# Altium schematic symbol library jlcpcb_2025_04_inductors_extended_0603.schlib: 1269 symbols (part 2 of 7) (continued)
## FCI1608F-R47K
designator L?  Inductance: 470nH
Inductor, 470nH, ±10%, 1.35Ω, 35mA, SMD 0603; Manufacturer: TAI-TECH; Manufacturer Part Number: FCI1608F-R47K; Package Size: 0603; JLCPCB Basic Part: No; JLCPCB Part Number: C155015; Supplier 1: LCSC; Category: Inductors; Supplier Part Number 1: C155015; Tolerance: ±10%; Rated Current: 35mA; DC Resistance: 1.35Ω; RoHS: Yes; ComponentLink1Description: Datasheet; ComponentLink1URL: https://wmsc.lcsc.com/wmsc/upload/file/pdf/v2/lcsc/2009171305_TAI-TECH-FCI1608F-R47K_C155015.pdf; ComponentLink2Description: JLCPCB Part URL; ComponentLink2URL: https://jlcpcb.com/partdetail/C155015; ComponentLink3Description: LCSC Part URL; ComponentLink3URL: https://lcsc.com/product-detail/Inductors-SMD_TAI-TECH-TAI-TECH-FCI1608F-R47K_C155015.html
footprint IND-0603 (0603 (1608M) Inductor)
pins: 1, 2

## FCI1608F-R56K
designator L?  Inductance: 560nH
Inductor, 560nH, ±10%, 1.55Ω, 35mA, SMD 0603; Manufacturer: TAI-TECH; Manufacturer Part Number: FCI1608F-R56K; Package Size: 0603; JLCPCB Basic Part: No; JLCPCB Part Number: C155016; Supplier 1: LCSC; Category: Inductors; Supplier Part Number 1: C155016; Tolerance: ±10%; Rated Current: 35mA; DC Resistance: 1.55Ω; RoHS: Yes; ComponentLink1Description: Datasheet; ComponentLink1URL: https://wmsc.lcsc.com/wmsc/upload/file/pdf/v2/lcsc/2009171305_TAI-TECH-FCI1608F-R56K_C155016.pdf; ComponentLink2Description: JLCPCB Part URL; ComponentLink2URL: https://jlcpcb.com/partdetail/C155016; ComponentLink3Description: LCSC Part URL; ComponentLink3URL: https://lcsc.com/product-detail/Inductors-SMD_TAI-TECH-TAI-TECH-FCI1608F-R56K_C155016.html
footprint IND-0603 (0603 (1608M) Inductor)
pins: 1, 2

## FCI1608F-R68K
designator L?  Inductance: 680nH
Inductor, 680nH, ±10%, 1.7Ω, 35mA, SMD 0603; Manufacturer: TAI-TECH; Manufacturer Part Number: FCI1608F-R68K; Package Size: 0603; JLCPCB Basic Part: No; JLCPCB Part Number: C155017; Supplier 1: LCSC; Category: Inductors; Supplier Part Number 1: C155017; Tolerance: ±10%; Rated Current: 35mA; DC Resistance: 1.7Ω; RoHS: Yes; ComponentLink1Description: Datasheet; ComponentLink1URL: https://wmsc.lcsc.com/wmsc/upload/file/pdf/v2/lcsc/2009171305_TAI-TECH-FCI1608F-R68K_C155017.pdf; ComponentLink2Description: JLCPCB Part URL; ComponentLink2URL: https://jlcpcb.com/partdetail/C155017; ComponentLink3Description: LCSC Part URL; ComponentLink3URL: https://lcsc.com/product-detail/Inductors-SMD_TAI-TECH-TAI-TECH-FCI1608F-R68K_C155017.html
footprint IND-0603 (0603 (1608M) Inductor)
pins: 1, 2

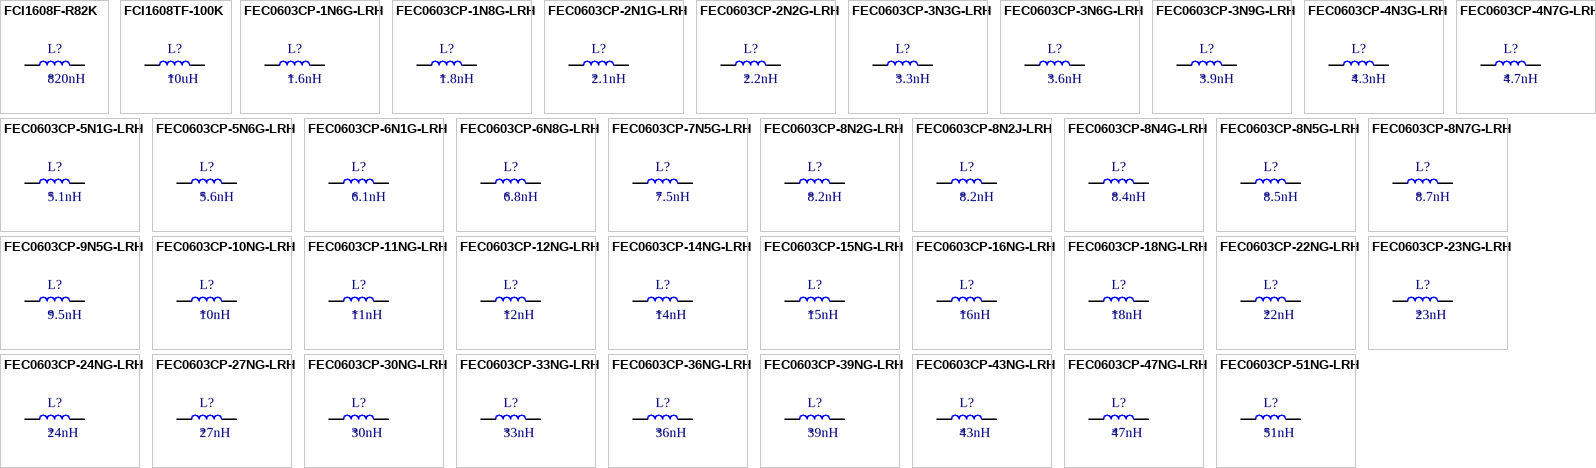
[diagram p6: symbols FCI1608F-R82K to FEC0603CP-51NG-LRH]

## FCI1608F-R82K
designator L?  Inductance: 820nH
Inductor, 820nH, ±10%, 2.1Ω, 35mA, SMD 0603; Manufacturer: TAI-TECH; Manufacturer Part Number: FCI1608F-R82K; Package Size: 0603; JLCPCB Basic Part: No; JLCPCB Part Number: C155018; Supplier 1: LCSC; Category: Inductors; Supplier Part Number 1: C155018; Tolerance: ±10%; Rated Current: 35mA; DC Resistance: 2.1Ω; RoHS: Yes; ComponentLink1Description: Datasheet; ComponentLink1URL: https://wmsc.lcsc.com/wmsc/upload/file/pdf/v2/lcsc/2009171305_TAI-TECH-FCI1608F-R82K_C155018.pdf; ComponentLink2Description: JLCPCB Part URL; ComponentLink2URL: https://jlcpcb.com/partdetail/C155018; ComponentLink3Description: LCSC Part URL; ComponentLink3URL: https://lcsc.com/product-detail/Inductors-SMD_TAI-TECH-TAI-TECH-FCI1608F-R82K_C155018.html
footprint IND-0603 (0603 (1608M) Inductor)
pins: 1, 2

## FCI1608TF-100K
designator L?  Inductance: 10uH
Inductor, 10uH, ±10%, 2.55Ω, 15mA, SMD 0603; Manufacturer: TAI-TECH; Manufacturer Part Number: FCI1608TF-100K; Package Size: 0603; JLCPCB Basic Part: No; JLCPCB Part Number: C304234; Supplier 1: LCSC; Category: Inductors; Supplier Part Number 1: C304234; Tolerance: ±10%; Rated Current: 15mA; DC Resistance: 2.55Ω; RoHS: Yes; ComponentLink1Description: Datasheet; ComponentLink1URL: https://wmsc.lcsc.com/wmsc/upload/file/pdf/v2/lcsc/2009171409_TAI-TECH-FCI1608TF-100K_C304234.pdf; ComponentLink2Description: JLCPCB Part URL; ComponentLink2URL: https://jlcpcb.com/partdetail/C304234; ComponentLink3Description: LCSC Part URL; ComponentLink3URL: https://lcsc.com/product-detail/Inductors-SMD_TAI-TECH-TAI-TECH-FCI1608TF-100K_C304234.html
footprint IND-0603 (0603 (1608M) Inductor)
pins: 1, 2

## FEC0603CP-1N6G-LRH
designator L?  Inductance: 1.6nH
Inductor, 1.6nH, ±2%, 30mΩ, 700mA, SMD 0603; Manufacturer: PSA(Prosperity Dielectrics); Manufacturer Part Number: FEC0603CP-1N6G-LRH; Package Size: 0603; JLCPCB Basic Part: No; JLCPCB Part Number: C346301; Supplier 1: LCSC; Category: Inductors; Supplier Part Number 1: C346301; Tolerance: ±2%; Rated Current: 700mA; DC Resistance: 30mΩ; RoHS: Yes; ComponentLink1Description: Datasheet; ComponentLink1URL: https://wmsc.lcsc.com/wmsc/upload/file/pdf/v2/lcsc/2304140030_PSA-Prosperity-Dielectrics-FEC0603CP-1N6G-LRH_C346301.pdf; ComponentLink2Description: JLCPCB Part URL; ComponentLink2URL: https://jlcpcb.com/partdetail/C346301; ComponentLink3Description: LCSC Part URL; ComponentLink3URL: https://lcsc.com/product-detail/Inductors-SMD_PSAProsperity-Dielectrics-PSAProsperity-Dielectrics-FEC0603CP-1N6G-LRH_C346301.html
footprint IND-0603 (0603 (1608M) Inductor)
pins: 1, 2

## FEC0603CP-1N8G-LRH
designator L?  Inductance: 1.8nH
Inductor, 1.8nH, ±2%, 45mΩ, 700mA, SMD 0603; Manufacturer: PSA(Prosperity Dielectrics); Manufacturer Part Number: FEC0603CP-1N8G-LRH; Package Size: 0603; JLCPCB Basic Part: No; JLCPCB Part Number: C346302; Supplier 1: LCSC; Category: Inductors; Supplier Part Number 1: C346302; Tolerance: ±2%; Rated Current: 700mA; DC Resistance: 45mΩ; RoHS: Yes; ComponentLink1Description: Datasheet; ComponentLink1URL: https://wmsc.lcsc.com/wmsc/upload/file/pdf/v2/lcsc/2304140030_PSA-Prosperity-Dielectrics-FEC0603CP-1N8G-LRH_C346302.pdf; ComponentLink2Description: JLCPCB Part URL; ComponentLink2URL: https://jlcpcb.com/partdetail/C346302; ComponentLink3Description: LCSC Part URL; ComponentLink3URL: https://lcsc.com/product-detail/Inductors-SMD_PSAProsperity-Dielectrics-PSAProsperity-Dielectrics-FEC0603CP-1N8G-LRH_C346302.html
footprint IND-0603 (0603 (1608M) Inductor)
pins: 1, 2

## FEC0603CP-2N1G-LRH
designator L?  Inductance: 2.1nH
Inductor, 2.1nH, ±2%, 5mΩ, 700mA, SMD 0603; Manufacturer: PSA(Prosperity Dielectrics); Manufacturer Part Number: FEC0603CP-2N1G-LRH; Package Size: 0603; JLCPCB Basic Part: No; JLCPCB Part Number: C346307; Supplier 1: LCSC; Category: Inductors; Supplier Part Number 1: C346307; Tolerance: ±2%; Rated Current: 700mA; DC Resistance: 5mΩ; RoHS: Yes; ComponentLink1Description: Datasheet; ComponentLink1URL: https://wmsc.lcsc.com/wmsc/upload/file/pdf/v2/lcsc/2304140030_PSA-Prosperity-Dielectrics-FEC0603CP-2N1G-LRH_C346307.pdf; ComponentLink2Description: JLCPCB Part URL; ComponentLink2URL: https://jlcpcb.com/partdetail/C346307; ComponentLink3Description: LCSC Part URL; ComponentLink3URL: https://lcsc.com/product-detail/Inductors-SMD_PSAProsperity-Dielectrics-PSAProsperity-Dielectrics-FEC0603CP-2N1G-LRH_C346307.html
footprint IND-0603 (0603 (1608M) Inductor)
pins: 1, 2

## FEC0603CP-2N2G-LRH
designator L?  Inductance: 2.2nH
Inductor, 2.2nH, ±2%, 5mΩ, 700mA, SMD 0603; Manufacturer: PSA(Prosperity Dielectrics); Manufacturer Part Number: FEC0603CP-2N2G-LRH; Package Size: 0603; JLCPCB Basic Part: No; JLCPCB Part Number: C346308; Supplier 1: LCSC; Category: Inductors; Supplier Part Number 1: C346308; Tolerance: ±2%; Rated Current: 700mA; DC Resistance: 5mΩ; RoHS: Yes; ComponentLink1Description: Datasheet; ComponentLink1URL: https://wmsc.lcsc.com/wmsc/upload/file/pdf/v2/lcsc/2304140030_PSA-Prosperity-Dielectrics-FEC0603CP-2N2G-LRH_C346308.pdf; ComponentLink2Description: JLCPCB Part URL; ComponentLink2URL: https://jlcpcb.com/partdetail/C346308; ComponentLink3Description: LCSC Part URL; ComponentLink3URL: https://lcsc.com/product-detail/Inductors-SMD_PSAProsperity-Dielectrics-PSAProsperity-Dielectrics-FEC0603CP-2N2G-LRH_C346308.html
footprint IND-0603 (0603 (1608M) Inductor)
pins: 1, 2

## FEC0603CP-3N3G-LRH
designator L?  Inductance: 3.3nH
Inductor, 3.3nH, ±2%, 70mΩ, 700mA, SMD 0603; Manufacturer: PSA(Prosperity Dielectrics); Manufacturer Part Number: FEC0603CP-3N3G-LRH; Package Size: 0603; JLCPCB Basic Part: No; JLCPCB Part Number: C346313; Supplier 1: LCSC; Category: Inductors; Supplier Part Number 1: C346313; Tolerance: ±2%; Rated Current: 700mA; DC Resistance: 70mΩ; RoHS: Yes; ComponentLink1Description: Datasheet; ComponentLink1URL: https://wmsc.lcsc.com/wmsc/upload/file/pdf/v2/lcsc/2304140030_PSA-Prosperity-Dielectrics-FEC0603CP-3N3G-LRH_C346313.pdf; ComponentLink2Description: JLCPCB Part URL; ComponentLink2URL: https://jlcpcb.com/partdetail/C346313; ComponentLink3Description: LCSC Part URL; ComponentLink3URL: https://lcsc.com/product-detail/Inductors-SMD_PSAProsperity-Dielectrics-PSAProsperity-Dielectrics-FEC0603CP-3N3G-LRH_C346313.html
footprint IND-0603 (0603 (1608M) Inductor)
pins: 1, 2

## FEC0603CP-3N6G-LRH
designator L?  Inductance: 3.6nH
Inductor, 3.6nH, ±2%, 63mΩ, 700mA, SMD 0603; Manufacturer: PSA(Prosperity Dielectrics); Manufacturer Part Number: FEC0603CP-3N6G-LRH; Package Size: 0603; JLCPCB Basic Part: No; JLCPCB Part Number: C346314; Supplier 1: LCSC; Category: Inductors; Supplier Part Number 1: C346314; Tolerance: ±2%; Rated Current: 700mA; DC Resistance: 63mΩ; RoHS: Yes; ComponentLink1Description: Datasheet; ComponentLink1URL: https://wmsc.lcsc.com/wmsc/upload/file/pdf/v2/lcsc/2304140030_PSA-Prosperity-Dielectrics-FEC0603CP-3N6G-LRH_C346314.pdf; ComponentLink2Description: JLCPCB Part URL; ComponentLink2URL: https://jlcpcb.com/partdetail/C346314; ComponentLink3Description: LCSC Part URL; ComponentLink3URL: https://lcsc.com/product-detail/Inductors-SMD_PSAProsperity-Dielectrics-PSAProsperity-Dielectrics-FEC0603CP-3N6G-LRH_C346314.html
footprint IND-0603 (0603 (1608M) Inductor)
pins: 1, 2

## FEC0603CP-3N9G-LRH
designator L?  Inductance: 3.9nH
Inductor, 3.9nH, ±2%, 80mΩ, 700mA, SMD 0603; Manufacturer: PSA(Prosperity Dielectrics); Manufacturer Part Number: FEC0603CP-3N9G-LRH; Package Size: 0603; JLCPCB Basic Part: No; JLCPCB Part Number: C346315; Supplier 1: LCSC; Category: Inductors; Supplier Part Number 1: C346315; Tolerance: ±2%; Rated Current: 700mA; DC Resistance: 80mΩ; RoHS: Yes; ComponentLink1Description: Datasheet; ComponentLink1URL: https://wmsc.lcsc.com/wmsc/upload/file/pdf/v2/lcsc/2304140030_PSA-Prosperity-Dielectrics-FEC0603CP-3N9G-LRH_C346315.pdf; ComponentLink2Description: JLCPCB Part URL; ComponentLink2URL: https://jlcpcb.com/partdetail/C346315; ComponentLink3Description: LCSC Part URL; ComponentLink3URL: https://lcsc.com/product-detail/Inductors-SMD_PSAProsperity-Dielectrics-PSAProsperity-Dielectrics-FEC0603CP-3N9G-LRH_C346315.html
footprint IND-0603 (0603 (1608M) Inductor)
pins: 1, 2

## FEC0603CP-4N3G-LRH
designator L?  Inductance: 4.3nH
Inductor, 4.3nH, ±2%, 63mΩ, 700mA, SMD 0603; Manufacturer: PSA(Prosperity Dielectrics); Manufacturer Part Number: FEC0603CP-4N3G-LRH; Package Size: 0603; JLCPCB Basic Part: No; JLCPCB Part Number: C346318; Supplier 1: LCSC; Category: Inductors; Supplier Part Number 1: C346318; Tolerance: ±2%; Rated Current: 700mA; DC Resistance: 63mΩ; RoHS: Yes; ComponentLink1Description: Datasheet; ComponentLink1URL: https://wmsc.lcsc.com/wmsc/upload/file/pdf/v2/lcsc/2304140030_PSA-Prosperity-Dielectrics-FEC0603CP-4N3G-LRH_C346318.pdf; ComponentLink2Description: JLCPCB Part URL; ComponentLink2URL: https://jlcpcb.com/partdetail/C346318; ComponentLink3Description: LCSC Part URL; ComponentLink3URL: https://lcsc.com/product-detail/Inductors-SMD_PSAProsperity-Dielectrics-PSAProsperity-Dielectrics-FEC0603CP-4N3G-LRH_C346318.html
footprint IND-0603 (0603 (1608M) Inductor)
pins: 1, 2

## FEC0603CP-4N7G-LRH
designator L?  Inductance: 4.7nH
Inductor, 4.7nH, ±2%, 116mΩ, 700mA, SMD 0603; Manufacturer: PSA(Prosperity Dielectrics); Manufacturer Part Number: FEC0603CP-4N7G-LRH; Package Size: 0603; JLCPCB Basic Part: No; JLCPCB Part Number: C346319; Supplier 1: LCSC; Category: Inductors; Supplier Part Number 1: C346319; Tolerance: ±2%; Rated Current: 700mA; DC Resistance: 116mΩ; RoHS: Yes; ComponentLink1Description: Datasheet; ComponentLink1URL: https://wmsc.lcsc.com/wmsc/upload/file/pdf/v2/lcsc/2304140030_PSA-Prosperity-Dielectrics-FEC0603CP-4N7G-LRH_C346319.pdf; ComponentLink2Description: JLCPCB Part URL; ComponentLink2URL: https://jlcpcb.com/partdetail/C346319; ComponentLink3Description: LCSC Part URL; ComponentLink3URL: https://lcsc.com/product-detail/Inductors-SMD_PSAProsperity-Dielectrics-PSAProsperity-Dielectrics-FEC0603CP-4N7G-LRH_C346319.html
footprint IND-0603 (0603 (1608M) Inductor)
pins: 1, 2

## FEC0603CP-5N1G-LRH
designator L?  Inductance: 5.1nH
Inductor, 5.1nH, ±2%, 140mΩ, 700mA, SMD 0603; Manufacturer: PSA(Prosperity Dielectrics); Manufacturer Part Number: FEC0603CP-5N1G-LRH; Package Size: 0603; JLCPCB Basic Part: No; JLCPCB Part Number: C346322; Supplier 1: LCSC; Category: Inductors; Supplier Part Number 1: C346322; Tolerance: ±2%; Rated Current: 700mA; DC Resistance: 140mΩ; RoHS: Yes; ComponentLink1Description: Datasheet; ComponentLink1URL: https://wmsc.lcsc.com/wmsc/upload/file/pdf/v2/lcsc/2304140030_PSA-Prosperity-Dielectrics-FEC0603CP-5N1G-LRH_C346322.pdf; ComponentLink2Description: JLCPCB Part URL; ComponentLink2URL: https://jlcpcb.com/partdetail/C346322; ComponentLink3Description: LCSC Part URL; ComponentLink3URL: https://lcsc.com/product-detail/Inductors-SMD_PSAProsperity-Dielectrics-PSAProsperity-Dielectrics-FEC0603CP-5N1G-LRH_C346322.html
footprint IND-0603 (0603 (1608M) Inductor)
pins: 1, 2

## FEC0603CP-5N6G-LRH
designator L?  Inductance: 5.6nH
Inductor, 5.6nH, ±2%, 150mΩ, 700mA, SMD 0603; Manufacturer: PSA(Prosperity Dielectrics); Manufacturer Part Number: FEC0603CP-5N6G-LRH; Package Size: 0603; JLCPCB Basic Part: No; JLCPCB Part Number: C346323; Supplier 1: LCSC; Category: Inductors; Supplier Part Number 1: C346323; Tolerance: ±2%; Rated Current: 700mA; DC Resistance: 150mΩ; RoHS: Yes; ComponentLink1Description: Datasheet; ComponentLink1URL: https://wmsc.lcsc.com/wmsc/upload/file/pdf/v2/lcsc/2304140030_PSA-Prosperity-Dielectrics-FEC0603CP-5N6G-LRH_C346323.pdf; ComponentLink2Description: JLCPCB Part URL; ComponentLink2URL: https://jlcpcb.com/partdetail/C346323; ComponentLink3Description: LCSC Part URL; ComponentLink3URL: https://lcsc.com/product-detail/Inductors-SMD_PSAProsperity-Dielectrics-PSAProsperity-Dielectrics-FEC0603CP-5N6G-LRH_C346323.html
footprint IND-0603 (0603 (1608M) Inductor)
pins: 1, 2

## FEC0603CP-6N1G-LRH
designator L?  Inductance: 6.1nH
Inductor, 6.1nH, ±2%, 110mΩ, 700mA, SMD 0603; Manufacturer: PSA(Prosperity Dielectrics); Manufacturer Part Number: FEC0603CP-6N1G-LRH; Package Size: 0603; JLCPCB Basic Part: No; JLCPCB Part Number: C346325; Supplier 1: LCSC; Category: Inductors; Supplier Part Number 1: C346325; Tolerance: ±2%; Rated Current: 700mA; DC Resistance: 110mΩ; RoHS: Yes; ComponentLink1Description: Datasheet; ComponentLink1URL: https://wmsc.lcsc.com/wmsc/upload/file/pdf/v2/lcsc/2304140030_PSA-Prosperity-Dielectrics-FEC0603CP-6N1G-LRH_C346325.pdf; ComponentLink2Description: JLCPCB Part URL; ComponentLink2URL: https://jlcpcb.com/partdetail/C346325; ComponentLink3Description: LCSC Part URL; ComponentLink3URL: https://lcsc.com/product-detail/Inductors-SMD_PSAProsperity-Dielectrics-PSAProsperity-Dielectrics-FEC0603CP-6N1G-LRH_C346325.html
footprint IND-0603 (0603 (1608M) Inductor)
pins: 1, 2

## FEC0603CP-6N8G-LRH
designator L?  Inductance: 6.8nH
Inductor, 6.8nH, ±2%, 110mΩ, 700mA, SMD 0603; Manufacturer: PSA(Prosperity Dielectrics); Manufacturer Part Number: FEC0603CP-6N8G-LRH; Package Size: 0603; JLCPCB Basic Part: No; JLCPCB Part Number: C346326; Supplier 1: LCSC; Category: Inductors; Supplier Part Number 1: C346326; Tolerance: ±2%; Rated Current: 700mA; DC Resistance: 110mΩ; RoHS: Yes; ComponentLink1Description: Datasheet; ComponentLink1URL: https://wmsc.lcsc.com/wmsc/upload/file/pdf/v2/lcsc/2304140030_PSA-Prosperity-Dielectrics-FEC0603CP-6N8G-LRH_C346326.pdf; ComponentLink2Description: JLCPCB Part URL; ComponentLink2URL: https://jlcpcb.com/partdetail/C346326; ComponentLink3Description: LCSC Part URL; ComponentLink3URL: https://lcsc.com/product-detail/Inductors-SMD_PSAProsperity-Dielectrics-PSAProsperity-Dielectrics-FEC0603CP-6N8G-LRH_C346326.html
footprint IND-0603 (0603 (1608M) Inductor)
pins: 1, 2

## FEC0603CP-7N5G-LRH
designator L?  Inductance: 7.5nH
Inductor, 7.5nH, ±2%, 106mΩ, 700mA, SMD 0603; Manufacturer: PSA(Prosperity Dielectrics); Manufacturer Part Number: FEC0603CP-7N5G-LRH; Package Size: 0603; JLCPCB Basic Part: No; JLCPCB Part Number: C346328; Supplier 1: LCSC; Category: Inductors; Supplier Part Number 1: C346328; Tolerance: ±2%; Rated Current: 700mA; DC Resistance: 106mΩ; RoHS: Yes; ComponentLink1Description: Datasheet; ComponentLink1URL: https://wmsc.lcsc.com/wmsc/upload/file/pdf/v2/lcsc/2304140030_PSA-Prosperity-Dielectrics-FEC0603CP-7N5G-LRH_C346328.pdf; ComponentLink2Description: JLCPCB Part URL; ComponentLink2URL: https://jlcpcb.com/partdetail/C346328; ComponentLink3Description: LCSC Part URL; ComponentLink3URL: https://lcsc.com/product-detail/Inductors-SMD_PSAProsperity-Dielectrics-PSAProsperity-Dielectrics-FEC0603CP-7N5G-LRH_C346328.html
footprint IND-0603 (0603 (1608M) Inductor)
pins: 1, 2

## FEC0603CP-8N2G-LRH
designator L?  Inductance: 8.2nH
Inductor, 8.2nH, ±2%, 120mΩ, 700mA, SMD 0603; Manufacturer: PSA(Prosperity Dielectrics); Manufacturer Part Number: FEC0603CP-8N2G-LRH; Package Size: 0603; JLCPCB Basic Part: No; JLCPCB Part Number: C346330; Supplier 1: LCSC; Category: Inductors; Supplier Part Number 1: C346330; Tolerance: ±2%; Rated Current: 700mA; DC Resistance: 120mΩ; RoHS: Yes; ComponentLink1Description: Datasheet; ComponentLink1URL: https://wmsc.lcsc.com/wmsc/upload/file/pdf/v2/lcsc/2304140030_PSA-Prosperity-Dielectrics-FEC0603CP-8N2G-LRH_C346330.pdf; ComponentLink2Description: JLCPCB Part URL; ComponentLink2URL: https://jlcpcb.com/partdetail/C346330; ComponentLink3Description: LCSC Part URL; ComponentLink3URL: https://lcsc.com/product-detail/Inductors-SMD_PSAProsperity-Dielectrics-PSAProsperity-Dielectrics-FEC0603CP-8N2G-LRH_C346330.html
footprint IND-0603 (0603 (1608M) Inductor)
pins: 1, 2

## FEC0603CP-8N2J-LRH
designator L?  Inductance: 8.2nH
Inductor, 8.2nH, ±5%, 120mΩ, 700mA, SMD 0603; Manufacturer: PSA(Prosperity Dielectrics); Manufacturer Part Number: FEC0603CP-8N2J-LRH; Package Size: 0603; JLCPCB Basic Part: No; JLCPCB Part Number: C329431; Supplier 1: LCSC; Category: Inductors; Supplier Part Number 1: C329431; Tolerance: ±5%; Rated Current: 700mA; DC Resistance: 120mΩ; RoHS: Yes; ComponentLink1Description: Datasheet; ComponentLink1URL: https://wmsc.lcsc.com/wmsc/upload/file/pdf/v2/lcsc/2304140030_PSA-Prosperity-Dielectrics-FEC0603CP-8N2J-LRH_C329431.pdf; ComponentLink2Description: JLCPCB Part URL; ComponentLink2URL: https://jlcpcb.com/partdetail/C329431; ComponentLink3Description: LCSC Part URL; ComponentLink3URL: https://lcsc.com/product-detail/Inductors-SMD_PSAProsperity-Dielectrics-PSAProsperity-Dielectrics-FEC0603CP-8N2J-LRH_C329431.html
footprint IND-0603 (0603 (1608M) Inductor)
pins: 1, 2

## FEC0603CP-8N4G-LRH
designator L?  Inductance: 8.4nH
Inductor, 8.4nH, ±2%, 109mΩ, 700mA, SMD 0603; Manufacturer: PSA(Prosperity Dielectrics); Manufacturer Part Number: FEC0603CP-8N4G-LRH; Self-Resonant Frequency: 4.6GHz; Q Factor: 28@250MHz; Package Size: 0603; JLCPCB Basic Part: No; JLCPCB Part Number: C346331; Supplier 1: LCSC; Category: Inductors; Supplier Part Number 1: C346331; Tolerance: ±2%; Rated Current: 700mA; DC Resistance: 109mΩ; RoHS: Yes; ComponentLink1Description: Datasheet; ComponentLink1URL: https://wmsc.lcsc.com/wmsc/upload/file/pdf/v2/lcsc/2304140030_PSA-Prosperity-Dielectrics-FEC0603CP-8N4G-LRH_C346331.pdf; ComponentLink2Description: JLCPCB Part URL; ComponentLink2URL: https://jlcpcb.com/partdetail/C346331; ComponentLink3Description: LCSC Part URL; ComponentLink3URL: https://lcsc.com/product-detail/Inductors-SMD_PSAProsperity-Dielectrics-PSAProsperity-Dielectrics-FEC0603CP-8N4G-LRH_C346331.html
footprint IND-0603 (0603 (1608M) Inductor)
pins: 1, 2

## FEC0603CP-8N5G-LRH
designator L?  Inductance: 8.5nH
Inductor, 8.5nH, ±2%, 109mΩ, 700mA, SMD 0603; Manufacturer: PSA(Prosperity Dielectrics); Manufacturer Part Number: FEC0603CP-8N5G-LRH; Self-Resonant Frequency: 4.6GHz; Q Factor: 28@250MHz; Package Size: 0603; JLCPCB Basic Part: No; JLCPCB Part Number: C346332; Supplier 1: LCSC; Category: Inductors; Supplier Part Number 1: C346332; Tolerance: ±2%; Rated Current: 700mA; DC Resistance: 109mΩ; RoHS: Yes; ComponentLink1Description: Datasheet; ComponentLink1URL: https://wmsc.lcsc.com/wmsc/upload/file/pdf/v2/lcsc/2304140030_PSA-Prosperity-Dielectrics-FEC0603CP-8N5G-LRH_C346332.pdf; ComponentLink2Description: JLCPCB Part URL; ComponentLink2URL: https://jlcpcb.com/partdetail/C346332; ComponentLink3Description: LCSC Part URL; ComponentLink3URL: https://lcsc.com/product-detail/Inductors-SMD_PSAProsperity-Dielectrics-PSAProsperity-Dielectrics-FEC0603CP-8N5G-LRH_C346332.html
footprint IND-0603 (0603 (1608M) Inductor)
pins: 1, 2

## FEC0603CP-8N7G-LRH
designator L?  Inductance: 8.7nH
Inductor, 8.7nH, ±2%, 109mΩ, 700mA, SMD 0603; Manufacturer: PSA(Prosperity Dielectrics); Manufacturer Part Number: FEC0603CP-8N7G-LRH; Self-Resonant Frequency: 4.6GHz; Q Factor: 28@250MHz; Package Size: 0603; JLCPCB Basic Part: No; JLCPCB Part Number: C346333; Supplier 1: LCSC; Category: Inductors; Supplier Part Number 1: C346333; Tolerance: ±2%; Rated Current: 700mA; DC Resistance: 109mΩ; RoHS: Yes; ComponentLink1Description: Datasheet; ComponentLink1URL: https://wmsc.lcsc.com/wmsc/upload/file/pdf/v2/lcsc/2304140030_PSA-Prosperity-Dielectrics-FEC0603CP-8N7G-LRH_C346333.pdf; ComponentLink2Description: JLCPCB Part URL; ComponentLink2URL: https://jlcpcb.com/partdetail/C346333; ComponentLink3Description: LCSC Part URL; ComponentLink3URL: https://lcsc.com/product-detail/Inductors-SMD_PSAProsperity-Dielectrics-PSAProsperity-Dielectrics-FEC0603CP-8N7G-LRH_C346333.html
footprint IND-0603 (0603 (1608M) Inductor)
pins: 1, 2

## FEC0603CP-9N5G-LRH
designator L?  Inductance: 9.5nH
Inductor, 9.5nH, ±2%, 135mΩ, 700mA, SMD 0603; Manufacturer: PSA(Prosperity Dielectrics); Manufacturer Part Number: FEC0603CP-9N5G-LRH; Self-Resonant Frequency: 5.4GHz; Q Factor: 28@250MHz; Package Size: 0603; JLCPCB Basic Part: No; JLCPCB Part Number: C346334; Supplier 1: LCSC; Category: Inductors; Supplier Part Number 1: C346334; Tolerance: ±2%; Rated Current: 700mA; DC Resistance: 135mΩ; RoHS: Yes; ComponentLink1Description: Datasheet; ComponentLink1URL: https://wmsc.lcsc.com/wmsc/upload/file/pdf/v2/lcsc/2304140030_PSA-Prosperity-Dielectrics-FEC0603CP-9N5G-LRH_C346334.pdf; ComponentLink2Description: JLCPCB Part URL; ComponentLink2URL: https://jlcpcb.com/partdetail/C346334; ComponentLink3Description: LCSC Part URL; ComponentLink3URL: https://lcsc.com/product-detail/Inductors-SMD_PSAProsperity-Dielectrics-PSAProsperity-Dielectrics-FEC0603CP-9N5G-LRH_C346334.html
footprint IND-0603 (0603 (1608M) Inductor)
pins: 1, 2

## FEC0603CP-10NG-LRH
designator L?  Inductance: 10nH
Inductor, 10nH, ±2%, 130mΩ, 700mA, SMD 0603; Manufacturer: PSA(Prosperity Dielectrics); Manufacturer Part Number: FEC0603CP-10NG-LRH; Package Size: 0603; JLCPCB Basic Part: No; JLCPCB Part Number: C346294; Supplier 1: LCSC; Category: Inductors; Supplier Part Number 1: C346294; Tolerance: ±2%; Rated Current: 700mA; DC Resistance: 130mΩ; RoHS: Yes; ComponentLink1Description: Datasheet; ComponentLink1URL: https://wmsc.lcsc.com/wmsc/upload/file/pdf/v2/lcsc/2304140030_PSA-Prosperity-Dielectrics-FEC0603CP-10NG-LRH_C346294.pdf; ComponentLink2Description: JLCPCB Part URL; ComponentLink2URL: https://jlcpcb.com/partdetail/C346294; ComponentLink3Description: LCSC Part URL; ComponentLink3URL: https://lcsc.com/product-detail/Inductors-SMD_PSAProsperity-Dielectrics-PSAProsperity-Dielectrics-FEC0603CP-10NG-LRH_C346294.html
footprint IND-0603 (0603 (1608M) Inductor)
pins: 1, 2

## FEC0603CP-11NG-LRH
designator L?  Inductance: 11nH
Inductor, 11nH, ±2%, 86mΩ, 700mA, SMD 0603; Manufacturer: PSA(Prosperity Dielectrics); Manufacturer Part Number: FEC0603CP-11NG-LRH; Package Size: 0603; JLCPCB Basic Part: No; JLCPCB Part Number: C346295; Supplier 1: LCSC; Category: Inductors; Supplier Part Number 1: C346295; Tolerance: ±2%; Rated Current: 700mA; DC Resistance: 86mΩ; RoHS: Yes; ComponentLink1Description: Datasheet; ComponentLink1URL: https://wmsc.lcsc.com/wmsc/upload/file/pdf/v2/lcsc/2304140030_PSA-Prosperity-Dielectrics-FEC0603CP-11NG-LRH_C346295.pdf; ComponentLink2Description: JLCPCB Part URL; ComponentLink2URL: https://jlcpcb.com/partdetail/C346295; ComponentLink3Description: LCSC Part URL; ComponentLink3URL: https://lcsc.com/product-detail/Inductors-SMD_PSAProsperity-Dielectrics-PSAProsperity-Dielectrics-FEC0603CP-11NG-LRH_C346295.html
footprint IND-0603 (0603 (1608M) Inductor)
pins: 1, 2

## FEC0603CP-12NG-LRH
designator L?  Inductance: 12nH
Inductor, 12nH, ±2%, 130mΩ, 700mA, SMD 0603; Manufacturer: PSA(Prosperity Dielectrics); Manufacturer Part Number: FEC0603CP-12NG-LRH; Package Size: 0603; JLCPCB Basic Part: No; JLCPCB Part Number: C346296; Supplier 1: LCSC; Category: Inductors; Supplier Part Number 1: C346296; Tolerance: ±2%; Rated Current: 700mA; DC Resistance: 130mΩ; RoHS: Yes; ComponentLink1Description: Datasheet; ComponentLink1URL: https://wmsc.lcsc.com/wmsc/upload/file/pdf/v2/lcsc/2304140030_PSA-Prosperity-Dielectrics-FEC0603CP-12NG-LRH_C346296.pdf; ComponentLink2Description: JLCPCB Part URL; ComponentLink2URL: https://jlcpcb.com/partdetail/C346296; ComponentLink3Description: LCSC Part URL; ComponentLink3URL: https://lcsc.com/product-detail/Inductors-SMD_PSAProsperity-Dielectrics-PSAProsperity-Dielectrics-FEC0603CP-12NG-LRH_C346296.html
footprint IND-0603 (0603 (1608M) Inductor)
pins: 1, 2

## FEC0603CP-14NG-LRH
designator L?  Inductance: 14nH
Inductor, 14nH, ±2%, 170mΩ, 700mA, SMD 0603; Manufacturer: PSA(Prosperity Dielectrics); Manufacturer Part Number: FEC0603CP-14NG-LRH; Package Size: 0603; JLCPCB Basic Part: No; JLCPCB Part Number: C346297; Supplier 1: LCSC; Category: Inductors; Supplier Part Number 1: C346297; Tolerance: ±2%; Rated Current: 700mA; DC Resistance: 170mΩ; RoHS: Yes; ComponentLink1Description: Datasheet; ComponentLink1URL: https://wmsc.lcsc.com/wmsc/upload/file/pdf/v2/lcsc/2304140030_PSA-Prosperity-Dielectrics-FEC0603CP-14NG-LRH_C346297.pdf; ComponentLink2Description: JLCPCB Part URL; ComponentLink2URL: https://jlcpcb.com/partdetail/C346297; ComponentLink3Description: LCSC Part URL; ComponentLink3URL: https://lcsc.com/product-detail/Inductors-SMD_PSAProsperity-Dielectrics-PSAProsperity-Dielectrics-FEC0603CP-14NG-LRH_C346297.html
footprint IND-0603 (0603 (1608M) Inductor)
pins: 1, 2

## FEC0603CP-15NG-LRH
designator L?  Inductance: 15nH
Inductor, 15nH, ±2%, 170mΩ, 700mA, SMD 0603; Manufacturer: PSA(Prosperity Dielectrics); Manufacturer Part Number: FEC0603CP-15NG-LRH; Package Size: 0603; JLCPCB Basic Part: No; JLCPCB Part Number: C346298; Supplier 1: LCSC; Category: Inductors; Supplier Part Number 1: C346298; Tolerance: ±2%; Rated Current: 700mA; DC Resistance: 170mΩ; RoHS: Yes; ComponentLink1Description: Datasheet; ComponentLink1URL: https://wmsc.lcsc.com/wmsc/upload/file/pdf/v2/lcsc/2304140030_PSA-Prosperity-Dielectrics-FEC0603CP-15NG-LRH_C346298.pdf; ComponentLink2Description: JLCPCB Part URL; ComponentLink2URL: https://jlcpcb.com/partdetail/C346298; ComponentLink3Description: LCSC Part URL; ComponentLink3URL: https://lcsc.com/product-detail/Inductors-SMD_PSAProsperity-Dielectrics-PSAProsperity-Dielectrics-FEC0603CP-15NG-LRH_C346298.html
footprint IND-0603 (0603 (1608M) Inductor)
pins: 1, 2

## FEC0603CP-16NG-LRH
designator L?  Inductance: 16nH
Inductor, 16nH, ±2%, 104mΩ, 700mA, SMD 0603; Manufacturer: PSA(Prosperity Dielectrics); Manufacturer Part Number: FEC0603CP-16NG-LRH; Package Size: 0603; JLCPCB Basic Part: No; JLCPCB Part Number: C346299; Supplier 1: LCSC; Category: Inductors; Supplier Part Number 1: C346299; Tolerance: ±2%; Rated Current: 700mA; DC Resistance: 104mΩ; RoHS: Yes; ComponentLink1Description: Datasheet; ComponentLink1URL: https://wmsc.lcsc.com/wmsc/upload/file/pdf/v2/lcsc/2304140030_PSA-Prosperity-Dielectrics-FEC0603CP-16NG-LRH_C346299.pdf; ComponentLink2Description: JLCPCB Part URL; ComponentLink2URL: https://jlcpcb.com/partdetail/C346299; ComponentLink3Description: LCSC Part URL; ComponentLink3URL: https://lcsc.com/product-detail/Inductors-SMD_PSAProsperity-Dielectrics-PSAProsperity-Dielectrics-FEC0603CP-16NG-LRH_C346299.html
footprint IND-0603 (0603 (1608M) Inductor)
pins: 1, 2

## FEC0603CP-18NG-LRH
designator L?  Inductance: 18nH
Inductor, 18nH, ±2%, 170mΩ, 700mA, SMD 0603; Manufacturer: PSA(Prosperity Dielectrics); Manufacturer Part Number: FEC0603CP-18NG-LRH; Package Size: 0603; JLCPCB Basic Part: No; JLCPCB Part Number: C346300; Supplier 1: LCSC; Category: Inductors; Supplier Part Number 1: C346300; Tolerance: ±2%; Rated Current: 700mA; DC Resistance: 170mΩ; RoHS: Yes; ComponentLink1Description: Datasheet; ComponentLink1URL: https://wmsc.lcsc.com/wmsc/upload/file/pdf/v2/lcsc/2304140030_PSA-Prosperity-Dielectrics-FEC0603CP-18NG-LRH_C346300.pdf; ComponentLink2Description: JLCPCB Part URL; ComponentLink2URL: https://jlcpcb.com/partdetail/C346300; ComponentLink3Description: LCSC Part URL; ComponentLink3URL: https://lcsc.com/product-detail/Inductors-SMD_PSAProsperity-Dielectrics-PSAProsperity-Dielectrics-FEC0603CP-18NG-LRH_C346300.html
footprint IND-0603 (0603 (1608M) Inductor)
pins: 1, 2

## FEC0603CP-22NG-LRH
designator L?  Inductance: 22nH
Inductor, 22nH, ±2%, 190mΩ, 700mA, SMD 0603; Manufacturer: PSA(Prosperity Dielectrics); Manufacturer Part Number: FEC0603CP-22NG-LRH; Package Size: 0603; JLCPCB Basic Part: No; JLCPCB Part Number: C346303; Supplier 1: LCSC; Category: Inductors; Supplier Part Number 1: C346303; Tolerance: ±2%; Rated Current: 700mA; DC Resistance: 190mΩ; RoHS: Yes; ComponentLink1Description: Datasheet; ComponentLink1URL: https://wmsc.lcsc.com/wmsc/upload/file/pdf/v2/lcsc/2304140030_PSA-Prosperity-Dielectrics-FEC0603CP-22NG-LRH_C346303.pdf; ComponentLink2Description: JLCPCB Part URL; ComponentLink2URL: https://jlcpcb.com/partdetail/C346303; ComponentLink3Description: LCSC Part URL; ComponentLink3URL: https://lcsc.com/product-detail/Inductors-SMD_PSAProsperity-Dielectrics-PSAProsperity-Dielectrics-FEC0603CP-22NG-LRH_C346303.html
footprint IND-0603 (0603 (1608M) Inductor)
pins: 1, 2

## FEC0603CP-23NG-LRH
designator L?  Inductance: 23nH
Inductor, 23nH, ±2%, 190mΩ, 700mA, SMD 0603; Manufacturer: PSA(Prosperity Dielectrics); Manufacturer Part Number: FEC0603CP-23NG-LRH; Package Size: 0603; JLCPCB Basic Part: No; JLCPCB Part Number: C346304; Supplier 1: LCSC; Category: Inductors; Supplier Part Number 1: C346304; Tolerance: ±2%; Rated Current: 700mA; DC Resistance: 190mΩ; RoHS: Yes; ComponentLink1Description: Datasheet; ComponentLink1URL: https://wmsc.lcsc.com/wmsc/upload/file/pdf/v2/lcsc/2304140030_PSA-Prosperity-Dielectrics-FEC0603CP-23NG-LRH_C346304.pdf; ComponentLink2Description: JLCPCB Part URL; ComponentLink2URL: https://jlcpcb.com/partdetail/C346304; ComponentLink3Description: LCSC Part URL; ComponentLink3URL: https://lcsc.com/product-detail/Inductors-SMD_PSAProsperity-Dielectrics-PSAProsperity-Dielectrics-FEC0603CP-23NG-LRH_C346304.html
footprint IND-0603 (0603 (1608M) Inductor)
pins: 1, 2

## FEC0603CP-24NG-LRH
designator L?  Inductance: 24nH
Inductor, 24nH, ±2%, 135mΩ, 700mA, SMD 0603; Manufacturer: PSA(Prosperity Dielectrics); Manufacturer Part Number: FEC0603CP-24NG-LRH; Package Size: 0603; JLCPCB Basic Part: No; JLCPCB Part Number: C346305; Supplier 1: LCSC; Category: Inductors; Supplier Part Number 1: C346305; Tolerance: ±2%; Rated Current: 700mA; DC Resistance: 135mΩ; RoHS: Yes; ComponentLink1Description: Datasheet; ComponentLink1URL: https://wmsc.lcsc.com/wmsc/upload/file/pdf/v2/lcsc/2304140030_PSA-Prosperity-Dielectrics-FEC0603CP-24NG-LRH_C346305.pdf; ComponentLink2Description: JLCPCB Part URL; ComponentLink2URL: https://jlcpcb.com/partdetail/C346305; ComponentLink3Description: LCSC Part URL; ComponentLink3URL: https://lcsc.com/product-detail/Inductors-SMD_PSAProsperity-Dielectrics-PSAProsperity-Dielectrics-FEC0603CP-24NG-LRH_C346305.html
footprint IND-0603 (0603 (1608M) Inductor)
pins: 1, 2

## FEC0603CP-27NG-LRH
designator L?  Inductance: 27nH
Inductor, 27nH, ±2%, 220mΩ, 600mA, SMD 0603; Manufacturer: PSA(Prosperity Dielectrics); Manufacturer Part Number: FEC0603CP-27NG-LRH; Package Size: 0603; JLCPCB Basic Part: No; JLCPCB Part Number: C346306; Supplier 1: LCSC; Category: Inductors; Supplier Part Number 1: C346306; Tolerance: ±2%; Rated Current: 600mA; DC Resistance: 220mΩ; RoHS: Yes; ComponentLink1Description: Datasheet; ComponentLink1URL: https://wmsc.lcsc.com/wmsc/upload/file/pdf/v2/lcsc/2304140030_PSA-Prosperity-Dielectrics-FEC0603CP-27NG-LRH_C346306.pdf; ComponentLink2Description: JLCPCB Part URL; ComponentLink2URL: https://jlcpcb.com/partdetail/C346306; ComponentLink3Description: LCSC Part URL; ComponentLink3URL: https://lcsc.com/product-detail/Inductors-SMD_PSAProsperity-Dielectrics-PSAProsperity-Dielectrics-FEC0603CP-27NG-LRH_C346306.html
footprint IND-0603 (0603 (1608M) Inductor)
pins: 1, 2

## FEC0603CP-30NG-LRH
designator L?  Inductance: 30nH
Inductor, 30nH, ±2%, 144mΩ, 600mA, SMD 0603; Manufacturer: PSA(Prosperity Dielectrics); Manufacturer Part Number: FEC0603CP-30NG-LRH; Package Size: 0603; JLCPCB Basic Part: No; JLCPCB Part Number: C346309; Supplier 1: LCSC; Category: Inductors; Supplier Part Number 1: C346309; Tolerance: ±2%; Rated Current: 600mA; DC Resistance: 144mΩ; RoHS: Yes; ComponentLink1Description: Datasheet; ComponentLink1URL: https://wmsc.lcsc.com/wmsc/upload/file/pdf/v2/lcsc/2304140030_PSA-Prosperity-Dielectrics-FEC0603CP-30NG-LRH_C346309.pdf; ComponentLink2Description: JLCPCB Part URL; ComponentLink2URL: https://jlcpcb.com/partdetail/C346309; ComponentLink3Description: LCSC Part URL; ComponentLink3URL: https://lcsc.com/product-detail/Inductors-SMD_PSAProsperity-Dielectrics-PSAProsperity-Dielectrics-FEC0603CP-30NG-LRH_C346309.html
footprint IND-0603 (0603 (1608M) Inductor)
pins: 1, 2

## FEC0603CP-33NG-LRH
designator L?  Inductance: 33nH
Inductor, 33nH, ±2%, 220mΩ, 600mA, SMD 0603; Manufacturer: PSA(Prosperity Dielectrics); Manufacturer Part Number: FEC0603CP-33NG-LRH; Package Size: 0603; JLCPCB Basic Part: No; JLCPCB Part Number: C346310; Supplier 1: LCSC; Category: Inductors; Supplier Part Number 1: C346310; Tolerance: ±2%; Rated Current: 600mA; DC Resistance: 220mΩ; RoHS: Yes; ComponentLink1Description: Datasheet; ComponentLink1URL: https://wmsc.lcsc.com/wmsc/upload/file/pdf/v2/lcsc/2304140030_PSA-Prosperity-Dielectrics-FEC0603CP-33NG-LRH_C346310.pdf; ComponentLink2Description: JLCPCB Part URL; ComponentLink2URL: https://jlcpcb.com/partdetail/C346310; ComponentLink3Description: LCSC Part URL; ComponentLink3URL: https://lcsc.com/product-detail/Inductors-SMD_PSAProsperity-Dielectrics-PSAProsperity-Dielectrics-FEC0603CP-33NG-LRH_C346310.html
footprint IND-0603 (0603 (1608M) Inductor)
pins: 1, 2

## FEC0603CP-36NG-LRH
designator L?  Inductance: 36nH
Inductor, 36nH, ±2%, 250mΩ, 600mA, SMD 0603; Manufacturer: PSA(Prosperity Dielectrics); Manufacturer Part Number: FEC0603CP-36NG-LRH; Package Size: 0603; JLCPCB Basic Part: No; JLCPCB Part Number: C346311; Supplier 1: LCSC; Category: Inductors; Supplier Part Number 1: C346311; Tolerance: ±2%; Rated Current: 600mA; DC Resistance: 250mΩ; RoHS: Yes; ComponentLink1Description: Datasheet; ComponentLink1URL: https://wmsc.lcsc.com/wmsc/upload/file/pdf/v2/lcsc/2304140030_PSA-Prosperity-Dielectrics-FEC0603CP-36NG-LRH_C346311.pdf; ComponentLink2Description: JLCPCB Part URL; ComponentLink2URL: https://jlcpcb.com/partdetail/C346311; ComponentLink3Description: LCSC Part URL; ComponentLink3URL: https://lcsc.com/product-detail/Inductors-SMD_PSAProsperity-Dielectrics-PSAProsperity-Dielectrics-FEC0603CP-36NG-LRH_C346311.html
footprint IND-0603 (0603 (1608M) Inductor)
pins: 1, 2

## FEC0603CP-39NG-LRH
designator L?  Inductance: 39nH
Inductor, 39nH, ±2%, 250mΩ, 600mA, SMD 0603; Manufacturer: PSA(Prosperity Dielectrics); Manufacturer Part Number: FEC0603CP-39NG-LRH; Package Size: 0603; JLCPCB Basic Part: No; JLCPCB Part Number: C346312; Supplier 1: LCSC; Category: Inductors; Supplier Part Number 1: C346312; Tolerance: ±2%; Rated Current: 600mA; DC Resistance: 250mΩ; RoHS: Yes; ComponentLink1Description: Datasheet; ComponentLink1URL: https://wmsc.lcsc.com/wmsc/upload/file/pdf/v2/lcsc/2304140030_PSA-Prosperity-Dielectrics-FEC0603CP-39NG-LRH_C346312.pdf; ComponentLink2Description: JLCPCB Part URL; ComponentLink2URL: https://jlcpcb.com/partdetail/C346312; ComponentLink3Description: LCSC Part URL; ComponentLink3URL: https://lcsc.com/product-detail/Inductors-SMD_PSAProsperity-Dielectrics-PSAProsperity-Dielectrics-FEC0603CP-39NG-LRH_C346312.html
footprint IND-0603 (0603 (1608M) Inductor)
pins: 1, 2

## FEC0603CP-43NG-LRH
designator L?  Inductance: 43nH
Inductor, 43nH, ±2%, 280mΩ, 600mA, SMD 0603; Manufacturer: PSA(Prosperity Dielectrics); Manufacturer Part Number: FEC0603CP-43NG-LRH; Package Size: 0603; JLCPCB Basic Part: No; JLCPCB Part Number: C346316; Supplier 1: LCSC; Category: Inductors; Supplier Part Number 1: C346316; Tolerance: ±2%; Rated Current: 600mA; DC Resistance: 280mΩ; RoHS: Yes; ComponentLink1Description: Datasheet; ComponentLink1URL: https://wmsc.lcsc.com/wmsc/upload/file/pdf/v2/lcsc/2304140030_PSA-Prosperity-Dielectrics-FEC0603CP-43NG-LRH_C346316.pdf; ComponentLink2Description: JLCPCB Part URL; ComponentLink2URL: https://jlcpcb.com/partdetail/C346316; ComponentLink3Description: LCSC Part URL; ComponentLink3URL: https://lcsc.com/product-detail/Inductors-SMD_PSAProsperity-Dielectrics-PSAProsperity-Dielectrics-FEC0603CP-43NG-LRH_C346316.html
footprint IND-0603 (0603 (1608M) Inductor)
pins: 1, 2

## FEC0603CP-47NG-LRH
designator L?  Inductance: 47nH
Inductor, 47nH, ±2%, 280mΩ, 600mA, SMD 0603; Manufacturer: PSA(Prosperity Dielectrics); Manufacturer Part Number: FEC0603CP-47NG-LRH; Package Size: 0603; JLCPCB Basic Part: No; JLCPCB Part Number: C346317; Supplier 1: LCSC; Category: Inductors; Supplier Part Number 1: C346317; Tolerance: ±2%; Rated Current: 600mA; DC Resistance: 280mΩ; RoHS: Yes; ComponentLink1Description: Datasheet; ComponentLink1URL: https://wmsc.lcsc.com/wmsc/upload/file/pdf/v2/lcsc/2304140030_PSA-Prosperity-Dielectrics-FEC0603CP-47NG-LRH_C346317.pdf; ComponentLink2Description: JLCPCB Part URL; ComponentLink2URL: https://jlcpcb.com/partdetail/C346317; ComponentLink3Description: LCSC Part URL; ComponentLink3URL: https://lcsc.com/product-detail/Inductors-SMD_PSAProsperity-Dielectrics-PSAProsperity-Dielectrics-FEC0603CP-47NG-LRH_C346317.html
footprint IND-0603 (0603 (1608M) Inductor)
pins: 1, 2

## FEC0603CP-51NG-LRH
designator L?  Inductance: 51nH
Inductor, 51nH, ±2%, 270mΩ, 600mA, SMD 0603; Manufacturer: PSA(Prosperity Dielectrics); Manufacturer Part Number: FEC0603CP-51NG-LRH; Package Size: 0603; JLCPCB Basic Part: No; JLCPCB Part Number: C346320; Supplier 1: LCSC; Category: Inductors; Supplier Part Number 1: C346320; Tolerance: ±2%; Rated Current: 600mA; DC Resistance: 270mΩ; RoHS: Yes; ComponentLink1Description: Datasheet; ComponentLink1URL: https://wmsc.lcsc.com/wmsc/upload/file/pdf/v2/lcsc/2304140030_PSA-Prosperity-Dielectrics-FEC0603CP-51NG-LRH_C346320.pdf; ComponentLink2Description: JLCPCB Part URL; ComponentLink2URL: https://jlcpcb.com/partdetail/C346320; ComponentLink3Description: LCSC Part URL; ComponentLink3URL: https://lcsc.com/product-detail/Inductors-SMD_PSAProsperity-Dielectrics-PSAProsperity-Dielectrics-FEC0603CP-51NG-LRH_C346320.html
footprint IND-0603 (0603 (1608M) Inductor)
pins: 1, 2

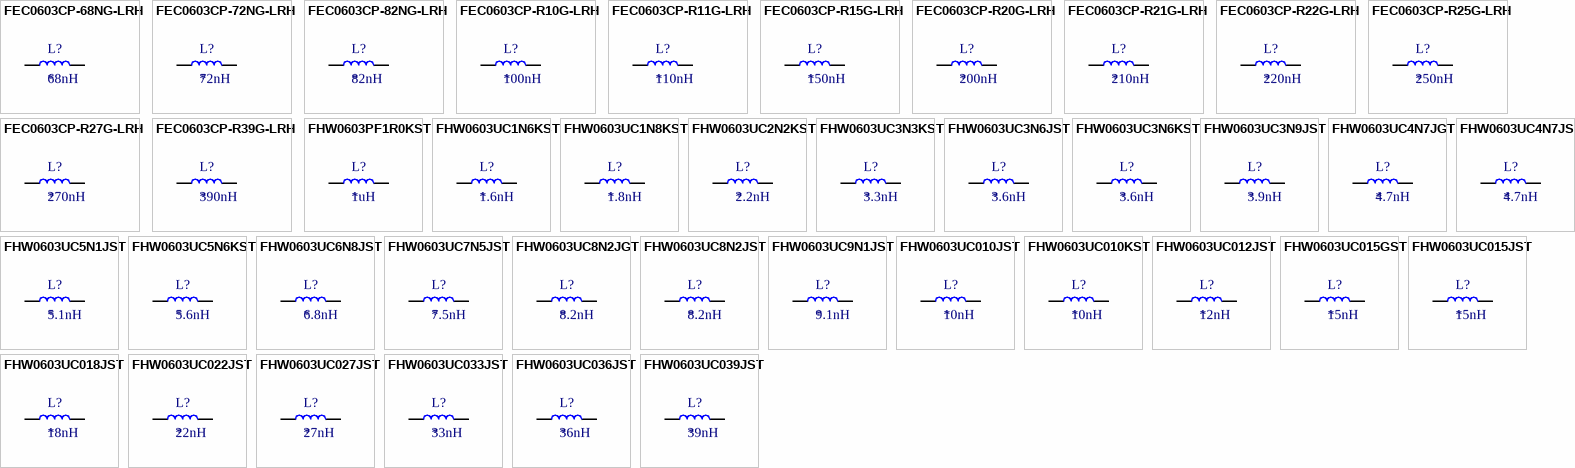
[diagram p7: symbols FEC0603CP-68NG-LRH to FHW0603UC039JST]

## FEC0603CP-68NG-LRH
designator L?  Inductance: 68nH
Inductor, 68nH, ±2%, 340mΩ, 600mA, SMD 0603; Manufacturer: PSA(Prosperity Dielectrics); Manufacturer Part Number: FEC0603CP-68NG-LRH; Package Size: 0603; JLCPCB Basic Part: No; JLCPCB Part Number: C346324; Supplier 1: LCSC; Category: Inductors; Supplier Part Number 1: C346324; Tolerance: ±2%; Rated Current: 600mA; DC Resistance: 340mΩ; RoHS: Yes; ComponentLink1Description: Datasheet; ComponentLink1URL: https://wmsc.lcsc.com/wmsc/upload/file/pdf/v2/lcsc/2304140030_PSA-Prosperity-Dielectrics-FEC0603CP-68NG-LRH_C346324.pdf; ComponentLink2Description: JLCPCB Part URL; ComponentLink2URL: https://jlcpcb.com/partdetail/C346324; ComponentLink3Description: LCSC Part URL; ComponentLink3URL: https://lcsc.com/product-detail/Inductors-SMD_PSAProsperity-Dielectrics-PSAProsperity-Dielectrics-FEC0603CP-68NG-LRH_C346324.html
footprint IND-0603 (0603 (1608M) Inductor)
pins: 1, 2

## FEC0603CP-72NG-LRH
designator L?  Inductance: 72nH
Inductor, 72nH, ±2%, 490mΩ, 400mA, SMD 0603; Manufacturer: PSA(Prosperity Dielectrics); Manufacturer Part Number: FEC0603CP-72NG-LRH; Package Size: 0603; JLCPCB Basic Part: No; JLCPCB Part Number: C346327; Supplier 1: LCSC; Category: Inductors; Supplier Part Number 1: C346327; Tolerance: ±2%; Rated Current: 400mA; DC Resistance: 490mΩ; RoHS: Yes; ComponentLink1Description: Datasheet; ComponentLink1URL: https://wmsc.lcsc.com/wmsc/upload/file/pdf/v2/lcsc/2304140030_PSA-Prosperity-Dielectrics-FEC0603CP-72NG-LRH_C346327.pdf; ComponentLink2Description: JLCPCB Part URL; ComponentLink2URL: https://jlcpcb.com/partdetail/C346327; ComponentLink3Description: LCSC Part URL; ComponentLink3URL: https://lcsc.com/product-detail/Inductors-SMD_PSAProsperity-Dielectrics-PSAProsperity-Dielectrics-FEC0603CP-72NG-LRH_C346327.html
footprint IND-0603 (0603 (1608M) Inductor)
pins: 1, 2

## FEC0603CP-82NG-LRH
designator L?  Inductance: 82nH
Inductor, 82nH, ±2%, 540mΩ, 400mA, SMD 0603; Manufacturer: PSA(Prosperity Dielectrics); Manufacturer Part Number: FEC0603CP-82NG-LRH; Package Size: 0603; JLCPCB Basic Part: No; JLCPCB Part Number: C346329; Supplier 1: LCSC; Category: Inductors; Supplier Part Number 1: C346329; Tolerance: ±2%; Rated Current: 400mA; DC Resistance: 540mΩ; RoHS: Yes; ComponentLink1Description: Datasheet; ComponentLink1URL: https://wmsc.lcsc.com/wmsc/upload/file/pdf/v2/lcsc/2304140030_PSA-Prosperity-Dielectrics-FEC0603CP-82NG-LRH_C346329.pdf; ComponentLink2Description: JLCPCB Part URL; ComponentLink2URL: https://jlcpcb.com/partdetail/C346329; ComponentLink3Description: LCSC Part URL; ComponentLink3URL: https://lcsc.com/product-detail/Inductors-SMD_PSAProsperity-Dielectrics-PSAProsperity-Dielectrics-FEC0603CP-82NG-LRH_C346329.html
footprint IND-0603 (0603 (1608M) Inductor)
pins: 1, 2
